# Altium footprint library self_pcblib v1.8.6.PcbLib: 123 footprints (part 7 of 8)
Each footprint in its own frame and in the unit in brackets; x right, y up, seen from the top. Pads: shape width x height; smd on the part's side, far side on the other; paste and mask are expansions set on the pad; w line width, h text height; cw(c..) or ccw(c..) is an arc to the next point about the centre after c.
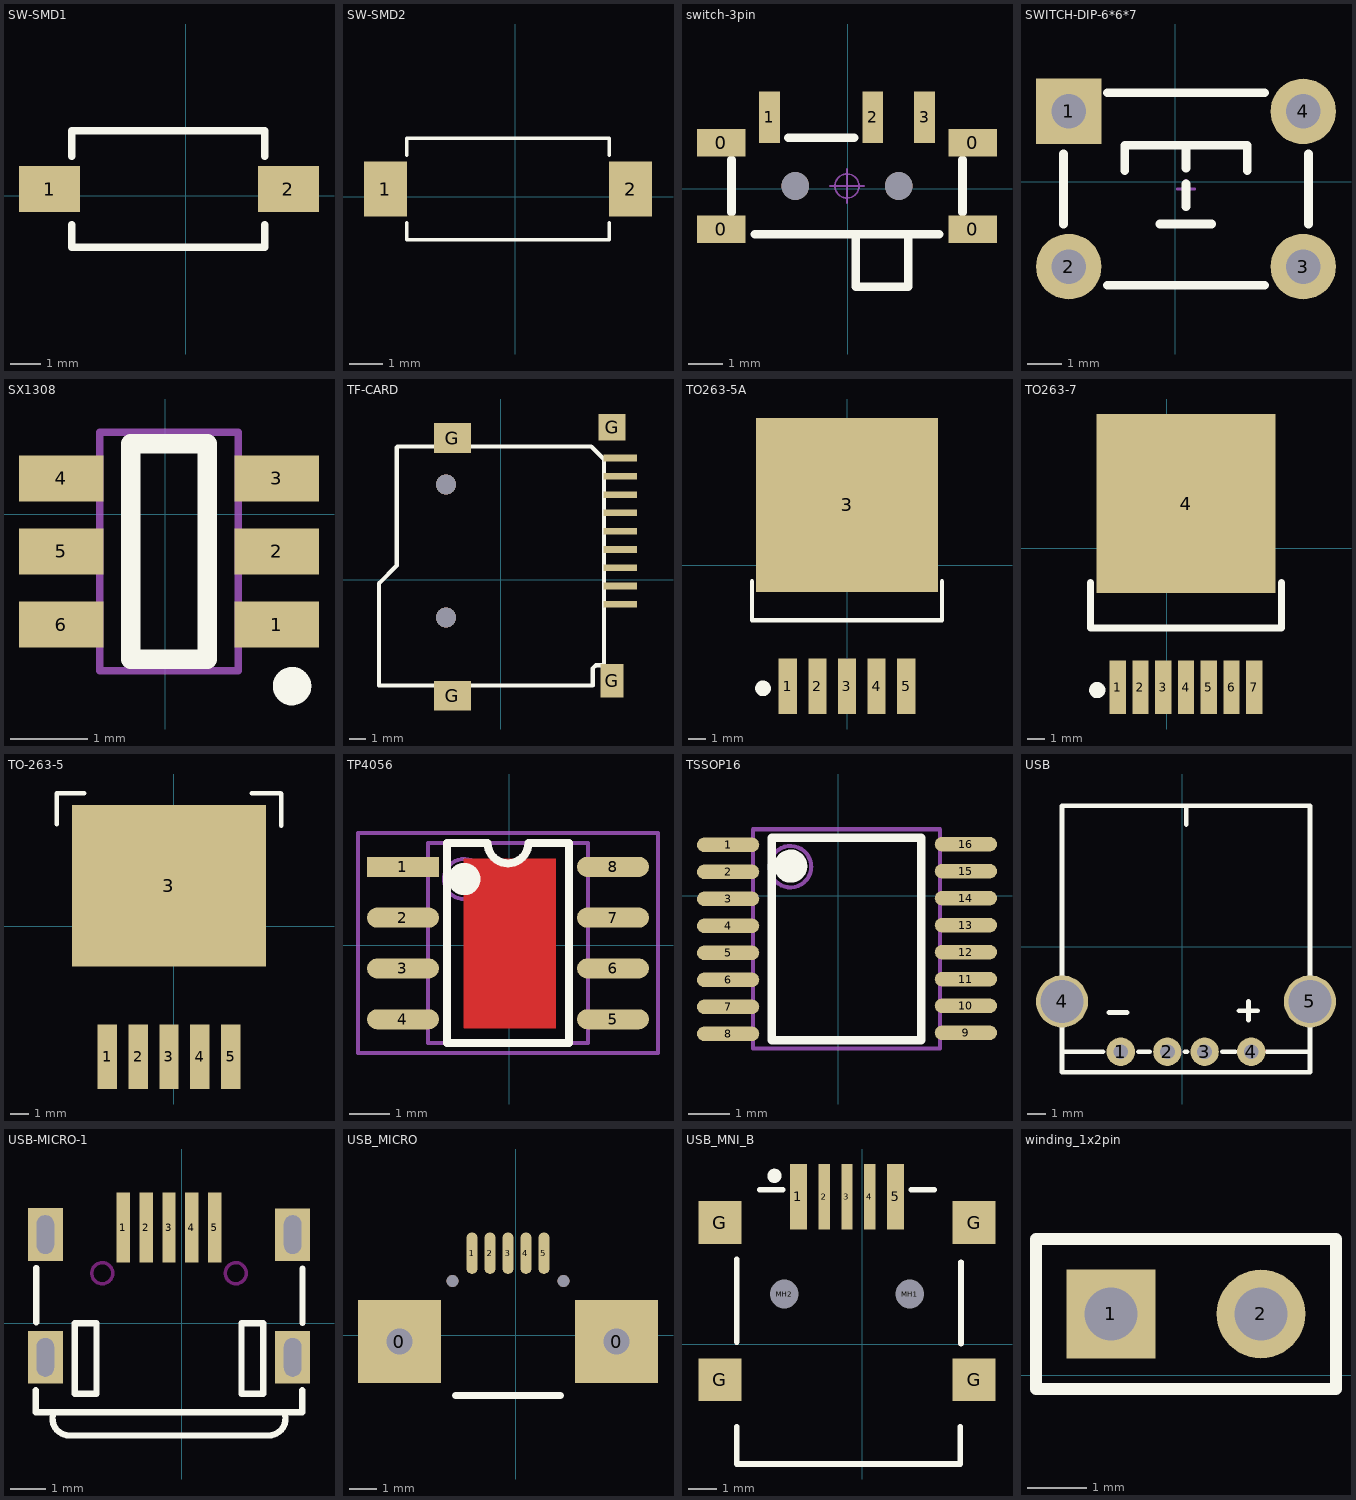
[diagram p6: the footprints below, top view; thin cyan lines are the x and y axes]

## SW-SMD1 [mm]
pads (2):
  rect 2x1.5 smd: 1(-4.445,0.229) 2(3.355,0.229)
Top Overlay:
  lines w0.254: -3.72,-0.94 -3.72,-1.671 2.58,-1.671 2.58,-0.94 ; -3.72,1.295 -3.72,2.129 2.58,2.129 2.58,1.295
3D body "SMD按键.STEP": height 2.5, standoff 0, extent -4.504,-1.716 3.386,2.134

## SW-SMD2 [mm]
pads (2):
  rect 1.3x1.651 smd: 1(-3.901,0.235) 2(3.465,0.235)
Top Overlay:
  lines w0.1: -3.266,-0.781 -3.266,-1.289 2.83,-1.289 2.83,-0.781 ; -3.266,1.251 -3.266,1.759 2.83,1.759 2.83,1.251
3D body "按键.STEP": height 1.9, standoff 0, extent -3.518,-1.314 3.082,1.886

## switch-3pin [mm]
pads (9):
  rect 1.4x0.8 smd: 0(-3.675,-1.174) 0(-3.675,1.326) 0(3.625,-1.174) 0(3.625,1.326)
  rect 0.6x1.5 smd: 1(-2.275,2.072) 2(0.725,2.072) 3(2.225,2.072)
  round 0.8 hole 0.8: " "(-1.525,0.076) " "(1.475,0.076)
Top Overlay:
  lines w0.254: -3.375,-0.686 -3.375,0.838 ; -2.692,-1.321 2.642,-1.321 ; -1.724,1.473 0.181,1.473 ; 0.229,-1.324 0.229,-2.845 1.753,-2.845 1.753,-1.324 ; 3.325,-0.686 3.325,0.838
Mechanical 15:
  circle w0.05: c-0.025,0.076 r0.35
  lines w0.05: -0.525,0.076 0.475,0.076 ; -0.025,-0.424 -0.025,0.576
3D body "MSK-12C01-07.STEP": height 1.5, standoff -0.5, extent -3.945,-2.824 3.895,2.476

## SWITCH-DIP-6*6*7 [mm]
pads (4):
  rect 1.9x1.9 hole 1: 1(-3.095,2.047)
  round 1.9 hole 1: 2(-3.095,-2.453) 3(3.705,-2.453) 4(3.705,2.047)
Top Overlay:
  lines w0.254: -3.251,-1.219 -3.251,0.813 ; -1.981,-2.997 2.591,-2.997 ; -1.981,2.591 2.591,2.591 ; -1.473,0.33 -1.473,1.067 2.083,1.067 2.083,0.33 ; -0.457,-1.219 1.041,-1.219 ; 0.305,-0.711 0.305,-0.051 ; 0.305,0.406 0.305,1.067 ; 3.861,-1.219 3.861,0.813
Bottom Overlay:
  lines w0.254: -1.981,-2.489 2.591,-2.489 ; -1.981,2.083 2.591,2.083
Mechanical 15:
  lines w0.076: 0.051,-0.203 0.559,-0.203 ; 0.305,-0.457 0.305,0.051
3D body "TSW DIP-6x6x7.STEP": height 6.95, standoff -3.45, extent -3.801,-3.203 4.411,2.797

## SX1308 [mm]
pads (6):
  rect 1.1x0.6 smd: 1(1.451,-1.433) 2(1.451,-0.483) 3(1.451,0.467) 4(-1.349,0.467) 5(-1.349,-0.483) 6(-1.349,-1.433)
Top Overlay:
  circle w0.25: c1.651,-2.233 r0.125
  lines w0.254: -0.449,-1.883 -0.449,0.917 0.551,0.917 0.551,-1.883 -0.449,-1.883
Mechanical 13:
  lines w0.1: -0.849,-2.033 -0.849,1.067 0.951,1.067 0.951,-2.033 -0.849,-2.033
3D body "User Library-SOT23-6-4.STEP": height 1, standoff -0.1, extent -1.155,-1.933 1.245,0.967

## TF-CARD [mm]
pads (13):
  rect 2x0.4 smd: 1(7.191,-1.488) 2(7.191,-0.388) 3(7.191,0.712) 4(7.191,1.812) 5(7.191,2.912) 6(7.191,4.012) 7(7.191,5.112) 8(7.191,6.212) 9(7.191,7.312)
  rect 2.2x1.8 smd: G(-2.909,-6.988) G(-2.909,8.512)
  rect 1.4x2 smd: G(6.691,-6.088)
  rect 1.6x1.6 smd: G(6.691,9.162)
via -3.309,5.712 diameter 1.2 hole 1.2
via -3.309,-2.288 diameter 1.2 hole 1.2
Top Overlay:
  lines w0.254: -7.329,-6.368 -7.329,-0.226 -6.262,0.841 -6.262,7.953 -6.214,8.001 5.443,8.001 6.205,7.239 6.205,7.112 6.205,-5.153 5.727,-5.153 5.524,-5.356 5.524,-6.372 -7.325,-6.372
3D body "Micro SD.STEP": height 0.1, standoff -2.37, extent -7.227,-7.269 7.983,9.037

## TO263-5A [mm]
pads (6):
  rect 1.05x3.2 smd: 1(-3.425,-6.934) 2(-1.725,-6.934) 3(-0.025,-6.934) 4(1.675,-6.934) 5(3.375,-6.934)
  rect 10.45x10 smd: 3(-0.025,3.48)
Top Overlay:
  circle w0.5: c-4.851,-7.061 r0.2
  lines w0.254: -5.486,-0.897 -5.486,-3.147 5.436,-3.147 5.436,-0.897
3D body "TO263-5A.STEP": height 4.5, standoff 0, extent -5.025,-6.945 4.975,6.383

## TO263-7 [mm]
pads (8):
  rect 0.9x3 smd: 1(-2.731,-7.752) 2(-1.461,-7.752) 3(-0.191,-7.752) 4(1.079,-7.752) 5(2.349,-7.752) 6(3.619,-7.752) 7(4.889,-7.752)
  rect 10x10 smd: 4(1.079,2.494)
Top Overlay:
  circle w0.5: c-3.874,-7.92 r0.2
  lines w0.381: -4.255,-1.91 -4.255,-4.45 6.413,-4.45 6.413,-1.91
3D body "TO263-7A.STEP": height 4.4, standoff -0.01, extent -3.921,-7.762 6.079,5.565

## TO-263-5 [mil]
pads (6):
  rect 42x140 smd: 1(-144.6,-282.2) 2(-77.6,-282.2) 3(-10.6,-282.2) 4(56.4,-282.2) 5(123.4,-282.2)
  rect 420x350 smd: 3(-10.6,87.8)
Top Overlay:
  lines w10: -253.6,221.8 -253.6,288.8 -194.6,288.8 ; 168.4,288.8 231.4,288.8 232.4,287.8 232.4,217.8
3D body "TO-263-5.step": height 179.92, standoff -0.39, extent -210.6,-315.41 189.4,261.01

## TP4056 [mm]
pads (8):
  rect 1.8x0.5 smd: 1(-2.65,1.956)
  oval 1.8x0.5 smd: 2(-2.65,0.686) 3(-2.65,-0.584) 4(-2.65,-1.854) 5(2.6,-1.854) 6(2.6,-0.584) 7(2.6,0.686) 8(2.6,1.956)
Top Layer:
  rectangle: -1.143,-2.083 1.168,2.159
Top Overlay:
  circle w0.5: c-1.12,1.651 r0.155
  lines w0.2: -1.549,2.551 -1.549,-2.449 1.499,-2.449 1.499,2.551
  lines w0.203: -1.549,2.551 -0.533,2.551 ccw(c-0.025,2.551) -0.025,2.043 ccw(c-0.025,2.551) 0.483,2.551 1.499,2.551
Mechanical 13:
  circle w0.1: c-1.125,1.651 r0.5
  lines w0.1: -2.025,-2.449 1.975,-2.449 1.975,2.551 -2.025,2.551 -2.025,-2.449
Mechanical 15:
  circle w0.05: c-0.025,0.051 r0.35
  lines w0.05: -0.525,0.051 0.475,0.051 ; -0.025,-0.449 -0.025,0.551
  lines w0.1: -3.775,-2.699 3.725,-2.699 3.725,2.801 -3.775,2.801 -3.775,-2.699
3D body "SOP8.STEP": height 1.9, standoff 0, extent -3.029,-2.449 2.978,2.551

## TSSOP16 [mm]
pads (16):
  oval 1.5x0.35 smd: 1(-2.647,1.223) 2(-2.647,0.573) 3(-2.647,-0.077) 4(-2.647,-0.727) 5(-2.647,-1.377) 6(-2.647,-2.027) 7(-2.647,-2.677) 8(-2.647,-3.327) 9(3.079,-3.303) 10(3.079,-2.653) 11(3.079,-2.011) 12(3.079,-1.361) 13(3.079,-0.711) 14(3.079,-0.061) 15(3.079,0.589) 16(3.079,1.239)
Top Overlay:
  circle w0.4: c-1.14,0.711 r0.2
  lines w0.2: -1.597,-3.48 -1.597,1.398 2.003,1.398 2.003,-3.48 -1.597,-3.48
Mechanical 13:
  circle w0.1: c-1.147,0.698 r0.5
  lines w0.1: -2.047,-3.683 -2.047,1.598 2.453,1.598 2.453,-3.683 -2.047,-3.683
3D body "User Library-TSSOP-16-1.STEP": height 1.1, standoff 0, extent -3.022,-3.552 3.378,1.448

## USB [mil]
pads (6):
  round 60 hole 31.5: 1(-129.61,-221.3) 2(-31.18,-221.3) 3(47.56,-221.3) 4(145.98,-221.3)
  round 110.24 hole 90.55: 4(-253.62,-115) 5(270,-115)
Top Overlay:
  lines w10: -253.62,-221.3 -167.01,-221.3 ; -155.2,-138.62 -115.83,-138.62 ; -92.2,-221.3 -68.58,-221.3 ; 6.22,-221.3 10.16,-221.3 ; 8.58,259.02 8.58,298.39 ; 84.96,-221.3 112.52,-221.3 ; 120.39,-134.68 159.76,-134.68 ; 140.08,-154.37 140.08,-115 ; 179.45,-221.3 270,-221.3 ; -253.62,-264.61 -253.62,298.39 270,298.39 270,-264.61 -253.62,-264.61
3D body "Samtec-USBR-A-S-S-O-TH.STEP": height 297.24, standoff -129.92, extent -302.64,-264.61 319.39,292.87

## USB-MICRO-1 [mm]
pads (9):
  rect 0.381x2 smd: 1(-1.661,2.733) 2(-1.011,2.733) 3(-0.361,2.733) 4(0.289,2.733) 5(0.939,2.733)
  rect 1x1.5 hole 0.5 slot 1.1 at 90 deg: ""(-3.888,-0.965) ""(-3.888,2.535) ""(3.166,-0.965) ""(3.166,2.533)
Top Overlay:
  lines w0.178: -4.145,0.035 -4.145,1.584 ; -3.67,-2.614 ccw(c-3.203,-2.716) -3.203,-3.194 ; -3.228,-3.194 2.464,-3.194 ; 2.481,-3.194 ccw(c2.481,-2.716) 2.948,-2.614 ; 3.439,-1.905 3.439,-2.531 -4.161,-2.531 ; 3.449,0.009 3.449,1.559 ; -4.161,-2.531 -4.161,-1.905 -4.161,-2.531 ; -3.046,-2.005 -2.426,-2.005 -2.426,0.005 -3.046,0.005 -3.046,-2.005 ; 1.704,-2.005 2.324,-2.005 2.324,0.005 1.704,0.005 1.704,-2.005
Keep-Out Layer:
  circle w0.1: c1.544,1.432 r0.3
  circle w0.1: c-2.266,1.432 r0.3
3D body "MICRO USB.STEP": height 2.77, standoff -0.17, extent -4.445,-3.408 3.755,2.522

## USB_MICRO [mm]
pads (7):
  rect 3x3 / inner rect 3x3 / far side round 1.524 hole 0.94: 0(-4.207,-0.239) 0(3.643,-0.239)
  oval 0.4x1.5 smd: 1(-1.582,2.961) 2(-0.932,2.961) 3(-0.282,2.961) 4(0.368,2.961) 5(1.018,2.961)
via 1.718,1.953 diameter 0.432 hole 0.432
via -2.282,1.953 diameter 0.432 hole 0.432
Top Overlay:
  lines w0.254: -2.187,-2.189 1.623,-2.189
3D body "MicroUSB-B.step": height 2.64, standoff -0.66, extent -4.371,-2.087 3.829,3.343

## USB_MNI_B [mm]
pads (11):
  rect 0.6x2.3 smd: 1(-2.226,5.164) 5(1.174,5.164)
  rect 0.4x2.3 smd: 2(-1.326,5.164) 3(-0.526,5.164) 4(0.274,5.164)
  rect 1.5x1.5 smd: G(-4.976,-1.236) G(-4.976,4.264) G(3.924,-1.236) G(3.924,4.264)
  round 0.6 hole 1 unplated: MH1(1.674,1.764) MH2(-2.726,1.764)
Top Overlay:
  circle w0.25: c-3.066,5.899 r0.125
  lines w0.2: -4.387,-2.886 -4.387,-4.186 3.436,-4.186 3.436,-2.886 ; -4.387,0.084 -4.387,2.98 ; -3.576,5.414 -2.776,5.414 ; 1.724,5.414 2.524,5.414 ; 3.462,0.034 3.462,2.878
Mechanical 13:
  lines w0.1: -4.387,-4.183 3.462,-4.183
3D body "SW3dPS-USB_mini_B.STEP": height 3.95, standoff -1, extent -5.876,-4.094 4.824,5.106

## winding_1x2pin [mm]
pads (2):
  rect 1.5x1.5 hole 0.9: 1(-5.105,1.041)
  round 1.5 hole 0.9: 2(-2.565,1.041)
Top Overlay:
  lines w0.2: -6.375,-0.229 -6.375,2.311 -1.295,2.311 -1.295,-0.229 -6.375,-0.229
3D body "65776.stp": height 1.27, standoff -4.27, extent -6.35,-8.939 -1.27,1.421